# Altium footprint library Connectors THD.PcbLib: 631 footprints (part 37 of 46)
Each footprint in its own frame and in the unit in brackets; x right, y up, seen from the top. Pads: shape width x height; smd on the part's side, far side on the other; paste and mask are expansions set on the pad; w line width, h text height; cw(c..) or ccw(c..) is an arc to the next point about the centre after c.
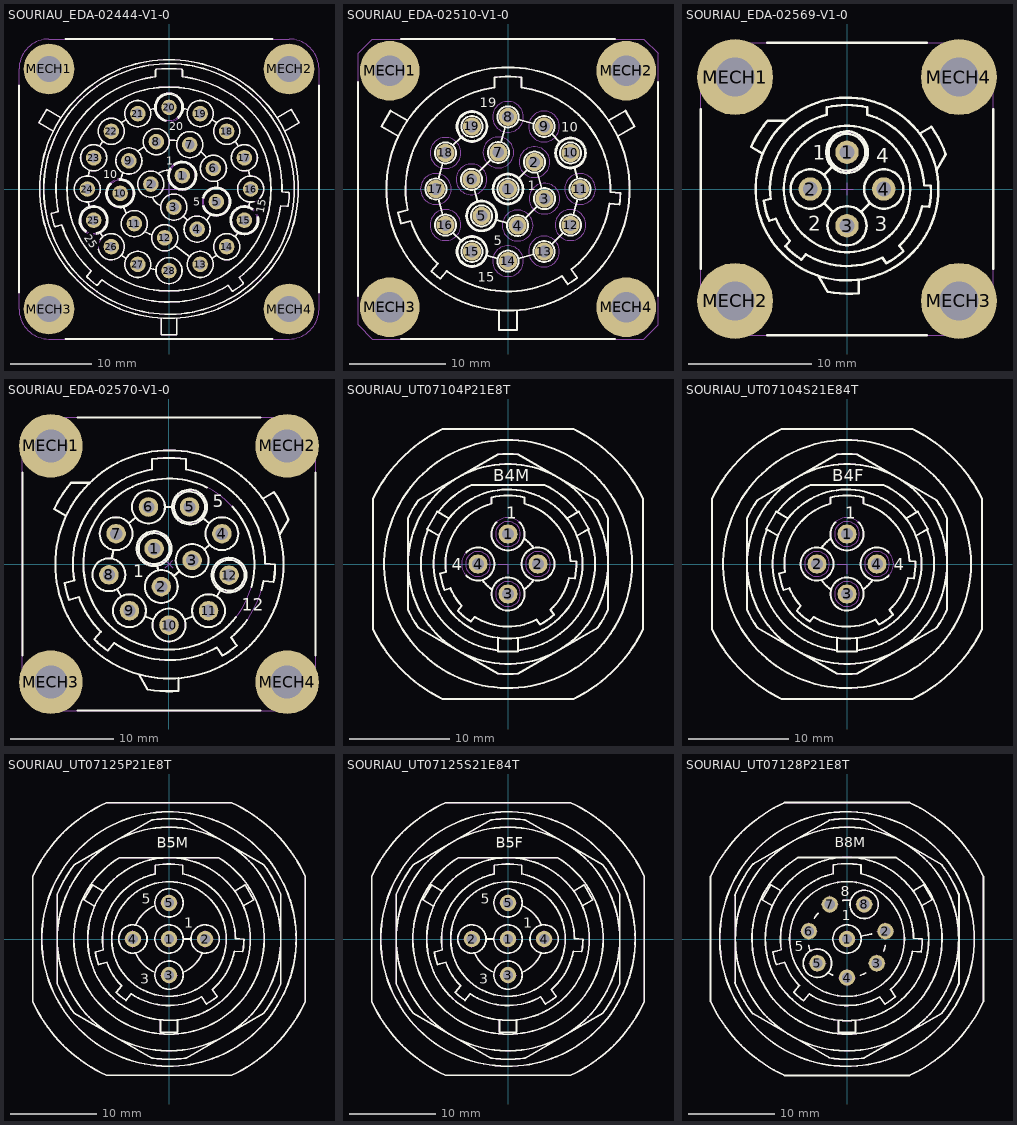
[diagram p36: the footprints below, top view; thin cyan lines are the x and y axes]

## SOURIAU_EDA-02444-V1-0 [mm] "Adapter Kit For PCB Mount For SOURIAU UTG02028S03, 28 Poles, Shell Size 20, Metalok Bantam Circular Female Connecteur"
height 37.35
pads (32):
  round 1.9 hole 1.2: 1(1.626,1.626) 2(-2.222,0.595) 3(0.595,-2.222) 4(3.441,-4.915) 5(5.796,-1.553) 6(5.438,2.536) 7(2.536,5.438) 8(-1.553,5.796) 9(-4.915,3.441) 10(-5.977,-0.523) 11(-4.243,-4.243) 12(-0.523,-5.977) 13(3.827,-9.239) 14(7.071,-7.071) 15(9.239,-3.827) 16(10,0) 17(9.239,3.827) 18(7.071,7.071) 19(3.827,9.239) 20(0,10) 21(-3.827,9.239) 22(-7.071,7.071) 23(-9.239,3.827) 24(-10,0) 25(-9.239,-3.827) 26(-7.071,-7.071) 27(-3.827,-9.239) 28(0,-10)
  round 6.2 hole 3.2: MECH1(-14.7,14.7) MECH2(14.7,14.7) MECH3(-14.7,-14.7) MECH4(14.7,-14.7)
Top Overlay:
  circle w0.2: c-4.915,3.441 r1.6
  circle w0.2: c-1.553,5.796 r1.6
  circle w0.2: c2.536,5.438 r1.6
  circle w0.2: c5.438,2.536 r1.6
  circle w0.2: c3.441,-4.915 r1.6
  circle w0.2: c-0.523,-5.977 r1.6
  circle w0.2: c0.595,-2.222 r1.6
  circle w0.2: c-2.222,0.595 r1.6
  circle w0.2: c-4.243,-4.243 r1.6
  circle w0.2: c7.071,-7.071 r1.6
  circle w0.2: c3.827,-9.239 r1.6
  circle w0.2: c0,-10 r1.6
  circle w0.2: c-3.827,-9.239 r1.6
  circle w0.2: c-10,0 r1.6
  circle w0.2: c-9.239,3.827 r1.6
  circle w0.2: c-7.071,7.071 r1.6
  circle w0.2: c-3.827,9.239 r1.6
  circle w0.2: c3.827,9.239 r1.6
  circle w0.2: c7.071,7.071 r1.6
  circle w0.2: c9.239,3.827 r1.6
  circle w0.2: c0,0 r12.5
  circle w0.2: c0,0 r15.35
  circle w0.2: c0,0 r15.85
  lines w0.2: -18.375,-12.7 -18.375,12.7 ; -14.175,7.093 -15.931,8.107 -14.986,9.743 -13.23,8.729 ; -12.7,-18.375 12.7,-18.375 ; -12.7,18.375 12.7,18.375 ; -10.238,-5.264 cw(c-9.239,-3.827) -8.844,-5.532 ; -10.152,-5.14 cw(c-9.239,-3.827) -8.878,-5.386 ; -9.872,-1.595 ccw(c0,0) -9.731,-2.304 ; -9.872,1.595 cw(c0,0) -9.731,2.304 ; -8.643,-7.367 ccw(c-7.071,-7.071) -8.414,-6.202 ; -8.51,-5.251 ccw(c0,0) -8.108,-5.853 ; -8.51,5.251 cw(c0,0) -8.108,5.853 ; -7.203,0.726 ccw(c-5.977,-0.523) -6.069,1.225 ; -7.098,0.619 ccw(c-5.977,-0.523) -6.061,1.075 ; -5.903,1.075 cw(c0,0) -5.65,2.02 ; -5.853,-8.108 ccw(c0,0) -5.251,-8.51 ; -5.853,8.108 cw(c0,0) -5.251,8.51 ; -5.626,-2.084 ccw(c0,0) -5.213,-2.971 ; -3.831,4.618 cw(c0,0) -3.029,5.179 ; -2.971,-5.213 ccw(c0,0) -2.084,-5.626 ; -2.304,-9.731 ccw(c0,0) -1.595,-9.872 ; -2.304,9.731 cw(c0,0) -1.595,9.872 ; -2.072,-0.998 ccw(c0,0) -0.998,-2.072 ; -1.296,1.9 cw(c0,0) 0.172,2.294 ; -0.945,-15.822 -0.945,-17.85 0.945,-17.85 0.945,-15.822 ; -0.395,8.295 cw(c0,10) 1.16,8.689 ; -0.361,8.441 cw(c0,10) 1.06,8.802 ; 0.034,6 cw(c0,0) 1.008,5.915 ; 0.115,2.508 ccw(c1.626,1.626) 0.567,3.019 ; 0.244,2.433 ccw(c1.626,1.626) 0.658,2.9 ; 0.757,-6.937 2.547,-8.279 ; 1.595,9.872 cw(c0,0) 2.304,9.731 ; 1.757,-3.321 2.279,-3.815 ; 3.883,4.574 cw(c0,0) 4.574,3.883 ; 4.111,-1.08 cw(c5.796,-1.553) 4.13,-2.09 ; 4.255,-1.121 cw(c5.796,-1.553) 4.273,-2.044 ; 4.618,-3.831 ccw(c0,0) 5.179,-3.029 ; 5.251,-8.51 ccw(c0,0) 5.853,-8.108 ; 5.251,8.51 cw(c0,0) 5.853,8.108 ; 5.915,1.008 cw(c0,0) 6,0.034 ; 8.108,-5.853 ccw(c0,0) 8.51,-5.251 ; 8.108,5.853 cw(c0,0) 8.51,5.251 ; 9.731,-2.304 ccw(c0,0) 9.872,-1.595 ; 9.731,2.304 cw(c0,0) 9.872,1.595 ; 10.168,-2.525 ccw(c9.239,-3.827) 10.789,-3.429 ; 10.255,-2.402 ccw(c9.239,-3.827) 10.934,-3.392 ; 10.407,-1.547 cw(c10,0) 11.118,-1.144 ; 13.23,8.729 14.986,9.743 15.931,8.107 14.175,7.093 ; 18.375,-12.7 18.375,12.7 ; -14.414,-3.13 cw(c-14.267,-3.098) -14.306,-2.953 -13.573,-2.757 cw(c0,0) -1.65,13.751 -1.65,14.523 cw(c-1.5,14.523) -1.515,14.672 cw(c0,0) 1.515,14.672 cw(c1.5,14.523) 1.65,14.523 1.65,13.751 cw(c0,0) 13.845,-0.358 14.602,-0.424 cw(c14.589,-0.574) 14.739,-0.58 cw(c0,0) 14.615,-1.989 cw(c14.467,-1.968) 14.454,-2.118 13.697,-2.052 cw(c0,0) 8.625,-10.836 9.061,-11.458 cw(c8.938,-11.544) 9.03,-11.663 cw(c0,0) 7.871,-12.474 cw(c7.791,-12.347) 7.668,-12.433 7.233,-11.811 cw(c0,0) -8.235,-11.136 -8.723,-11.718 cw(c-8.838,-11.621) -8.928,-11.741 cw(c0,0) -10.012,-10.832 cw(c-9.91,-10.721) -10.025,-10.625 -9.537,-10.043 cw(c0,0) -13.133,-4.399 -13.866,-4.595 cw(c-13.905,-4.451) -14.048,-4.496 cw(c0,0) -14.414,-3.13
  text "25" at -10.429,-5.998 h1
  text "20" at 0,7.2 h1
  text "15" at 11.634,-3.04 h1
  text "10" at -8.041,1.315 h1
  text "5" at 2.962,-2.053 h1
  text "1" at -0.331,2.965 h1
Mechanical 8:
  circle w0.1: c-14.7,-14.7 r1.6
  circle w0.1: c14.7,-14.7 r1.6
  circle w0.1: c14.7,14.7 r1.6
  circle w0.1: c-14.7,14.7 r1.6
  lines w0.1: -15.2,-14.7 -14.7,-14.7 ; -15.2,14.7 -14.7,14.7 ; -14.7,-15.2 -14.7,-14.7 ; -14.7,-14.2 -14.7,-14.7 ; -14.7,14.2 -14.7,14.7 ; -14.7,15.2 -14.7,14.7 ; -14.2,-14.7 -14.7,-14.7 ; -14.2,14.7 -14.7,14.7 ; -10.5,0 -10,0 ; -10,-0.5 -10,0 ; -10,0.5 -10,0 ; -9.739,-3.827 -9.239,-3.827 ; -9.739,3.827 -9.239,3.827 ; -9.5,0 -10,0 ; -9.239,-4.327 -9.239,-3.827 ; -9.239,-3.327 -9.239,-3.827 ; -9.239,3.327 -9.239,3.827 ; -9.239,4.327 -9.239,3.827 ; -8.739,-3.827 -9.239,-3.827 ; -8.739,3.827 -9.239,3.827 ; -7.571,-7.071 -7.071,-7.071 ; -7.571,7.071 -7.071,7.071 ; -7.071,-7.571 -7.071,-7.071 ; -7.071,-6.571 -7.071,-7.071 ; -7.071,6.571 -7.071,7.071 ; -7.071,7.571 -7.071,7.071 ; -6.571,-7.071 -7.071,-7.071 ; -6.571,7.071 -7.071,7.071 ; -6.477,-0.523 -5.977,-0.523 ; -5.977,-1.023 -5.977,-0.523 ; -5.977,-0.023 -5.977,-0.523 ; -5.477,-0.523 -5.977,-0.523 ; -5.415,3.441 -4.915,3.441 ; -4.915,2.941 -4.915,3.441 ; -4.915,3.941 -4.915,3.441 ; -4.743,-4.243 -4.243,-4.243 ; -4.415,3.441 -4.915,3.441 ; -4.327,-9.239 -3.827,-9.239 ; -4.327,9.239 -3.827,9.239 ; -4.243,-4.743 -4.243,-4.243 ; -4.243,-3.743 -4.243,-4.243 ; -3.827,-9.739 -3.827,-9.239 ; -3.827,-8.739 -3.827,-9.239 ; -3.827,8.739 -3.827,9.239 ; -3.827,9.739 -3.827,9.239 ; -3.743,-4.243 -4.243,-4.243 ; -3.327,-9.239 -3.827,-9.239 ; -3.327,9.239 -3.827,9.239 ; -2.722,0.595 -2.222,0.595 ; -2.222,0.095 -2.222,0.595 ; -2.222,1.095 -2.222,0.595 ; -2.053,5.796 -1.553,5.796 ; -1.722,0.595 -2.222,0.595 ; -1.553,5.296 -1.553,5.796 ; -1.553,6.296 -1.553,5.796 ; -1.053,5.796 -1.553,5.796 ; -1.023,-5.977 -0.523,-5.977 ; -1,0 0,0 ; -0.523,-6.477 -0.523,-5.977 ; -0.523,-5.477 -0.523,-5.977 ; -0.5,-10 0,-10 ; -0.5,10 0,10 ; -0.023,-5.977 -0.523,-5.977 ; 0,-10.5 0,-10 ; 0,-9.5 0,-10 ; 0,-1 0,0 ; 0,1 0,0 ; 0,9.5 0,10 ; 0,10.5 0,10 ; 0.095,-2.222 0.595,-2.222 ; 0.5,-10 0,-10 ; 0.5,10 0,10 ; 0.595,-2.722 0.595,-2.222 ; 0.595,-1.722 0.595,-2.222 ; 1,0 0,0 ; 1.095,-2.222 0.595,-2.222 ; 1.126,1.626 1.626,1.626 ; 1.626,1.126 1.626,1.626 ; 1.626,2.126 1.626,1.626 ; 2.036,5.438 2.536,5.438 ; 2.126,1.626 1.626,1.626 ; 2.536,4.938 2.536,5.438 ; 2.536,5.938 2.536,5.438 ; 2.941,-4.915 3.441,-4.915 ; 3.036,5.438 2.536,5.438 ; 3.327,-9.239 3.827,-9.239 ; 3.327,9.239 3.827,9.239 ; 3.441,-5.415 3.441,-4.915 ; 3.441,-4.415 3.441,-4.915 ; 3.827,-9.739 3.827,-9.239 ; 3.827,-8.739 3.827,-9.239 ; 3.827,8.739 3.827,9.239 ; 3.827,9.739 3.827,9.239 ; 3.941,-4.915 3.441,-4.915 ; 4.327,-9.239 3.827,-9.239 ; 4.327,9.239 3.827,9.239 ; 4.938,2.536 5.438,2.536 ; 5.296,-1.553 5.796,-1.553 ; 5.438,2.036 5.438,2.536 ; 5.438,3.036 5.438,2.536 ; 5.796,-2.053 5.796,-1.553 ; 5.796,-1.053 5.796,-1.553 ; 5.938,2.536 5.438,2.536 ; 6.296,-1.553 5.796,-1.553 ; 6.571,-7.071 7.071,-7.071 ; 6.571,7.071 7.071,7.071 ; 7.071,-7.571 7.071,-7.071 ; 7.071,-6.571 7.071,-7.071 ; 7.071,6.571 7.071,7.071 ; 7.071,7.571 7.071,7.071 ; 7.571,-7.071 7.071,-7.071 ; 7.571,7.071 7.071,7.071 ; 8.739,-3.827 9.239,-3.827 ; 8.739,3.827 9.239,3.827 ; 9.239,-4.327 9.239,-3.827 ; 9.239,-3.327 9.239,-3.827 ; 9.239,3.327 9.239,3.827 ; 9.239,4.327 9.239,3.827 ; 9.5,0 10,0 ; 9.739,-3.827 9.239,-3.827 ; 9.739,3.827 9.239,3.827 ; 10,-0.5 10,0 ; 10,0.5 10,0 ; 10.5,0 10,0 ; 14.2,-14.7 14.7,-14.7 ; 14.2,14.7 14.7,14.7 ; 14.7,-15.2 14.7,-14.7 ; 14.7,-14.2 14.7,-14.7 ; 14.7,14.2 14.7,14.7 ; 14.7,15.2 14.7,14.7 ; 15.2,-14.7 14.7,-14.7 ; 15.2,14.7 14.7,14.7
Mechanical 14:
  drawing of 167 lines, arcs and shapes, not listed
  text "25" at -10.429,-5.998 h1
  text "20" at -0.15,7.037 h1
  text "15" at 11.634,-3.04 h1
  text "10" at -8.041,1.315 h1
  text "5" at 2.962,-2.053 h1
  text "1" at -0.331,2.965 h1
3D body: height 37, standoff -5.61, extent -18.375,-18.375 18.375,18.375

## SOURIAU_EDA-02510-V1-0 [mm] "Adapter Kit For PCB Mount For SOURIAU UTO02448P21T, 19 Poles, Shell Size 16, UT Bantam Circular Male Connector"
height 33.7
pads (23):
  round 1.9 hole 1.2: 1(0,0) 2(2.75,2.8) 3(3.8,-1) 4(1,-3.8) 5(-2.75,-2.8) 6(-3.8,1) 7(-1,3.8) 8(0,7.5) 9(3.75,6.5) 10(6.5,3.75) 11(7.5,0) 12(6.5,-3.75) 13(3.75,-6.5) 14(0,-7.5) 15(-3.75,-6.5) 16(-6.5,-3.75) 17(-7.5,0) 18(-6.5,3.75) 19(-3.75,6.5)
  round 6.2 hole 3.2: MECH1(-12.3,12.3) MECH2(12.3,12.3) MECH3(-12.3,-12.3) MECH4(12.3,-12.3)
Top Overlay:
  circle w0.2: c-3.75,-6.5 r1.1
  circle w0.2: c-3.75,-6.5 r1.5
  circle w0.2: c-3.75,-6.5 r1.6
  circle w0.2: c6.5,3.75 r1.1
  circle w0.2: c-3.75,6.5 r1.1
  circle w0.2: c-2.75,-2.8 r1.1
  circle w0.2: c-2.75,-2.8 r1.5
  circle w0.2: c-2.75,-2.8 r1.6
  circle w0.2: c6.5,3.75 r1.1
  circle w0.2: c6.5,3.75 r1.5
  circle w0.2: c6.5,3.75 r1.6
  circle w0.2: c-3.75,6.5 r1.5
  circle w0.2: c-3.75,6.5 r1.6
  circle w0.2: c-6.5,3.75 r1.1
  circle w0.2: c-7.5,0 r1.1
  circle w0.2: c-6.5,-3.75 r1.1
  circle w0.2: c0,-7.5 r1.1
  circle w0.2: c3.75,-6.5 r1.1
  circle w0.2: c6.5,-3.75 r1.1
  circle w0.2: c7.5,0 r1.1
  circle w0.2: c3.75,6.5 r1.1
  circle w0.2: c0,7.5 r1.1
  circle w0.2: c-1,3.8 r1.1
  circle w0.2: c-3.8,1 r1.1
  circle w0.2: c1,-3.8 r1.1
  circle w0.2: c3.8,-1 r1.1
  circle w0.2: c2.75,2.8 r1.1
  circle w0.2: c0,0 r1.1
  circle w0.2: c0,0 r1.5
  circle w0.2: c0,0 r1.6
  circle w0.2: c0,0 r12.65
  lines w0.2: -15.6,-11.134 -15.6,11.134 ; -11.397,5.489 -13.16,6.507 -12.215,8.143 -10.452,7.126 ; -11.134,-15.6 11.134,-15.6 ; -11.134,15.6 11.134,15.6 ; -7.217,-1.063 -6.783,-2.687 ; -7.217,1.063 -6.783,2.687 ; -5.722,-4.528 -4.881,-5.369 ; -5.722,4.528 -4.881,5.369 ; -3.507,-0.06 -3.176,-1.258 ; -3.022,1.778 -1.778,3.022 ; -2.204,-6.912 -1.063,-7.217 ; -1.204,-3.212 -0.063,-3.517 ; -0.945,-12.615 -0.945,-14.65 0.945,-14.65 0.945,-12.615 ; -0.713,4.862 -0.287,6.438 ; 1.063,-7.217 2.687,-6.783 ; 1.063,7.217 2.687,6.783 ; 1.121,1.142 1.979,2.015 ; 1.778,-3.022 3.022,-1.778 ; 3.043,1.74 3.507,0.06 ; 4.528,-5.722 5.722,-4.528 ; 4.528,5.722 5.369,4.881 ; 6.783,-2.687 7.217,-1.063 ; 6.912,2.204 7.217,1.063 ; 10.452,7.126 12.215,8.143 13.16,6.507 11.397,5.489 ; 15.6,-11.134 15.6,11.134 ; -11.442,-2.445 ccw(c0,0) -11.131,-3.604 -10.115,-3.332 ccw(c0,0) -7.294,-7.76 -7.97,-8.565 ccw(c0,0) -7.051,-9.337 -6.375,-8.531 ccw(c0,0) 5.607,-9.054 6.211,-9.916 ccw(c0,0) 7.194,-9.227 6.59,-8.366 ccw(c0,0) 10.54,-1.524 11.588,-1.616 ccw(c0,0) 11.692,-0.421 10.645,-0.329 ccw(c0,0) 1.4,10.558 1.4,11.616 ccw(c0,0) -1.4,11.616 -1.4,10.558 ccw(c0,0) -10.426,-2.172 -11.442,-2.445
  text "5" at -1.5,-5.845 h1
  text "15" at -3.136,-9.638 h1
  text "10" at 5.55,5.955 h1
  text "19" at -2.925,8.5 h1
  text "1" at 2.072,-0.107 h1
Mechanical 8:
  lines w0.1: -12.8,-12.3 -12.3,-12.3 ; -12.8,12.3 -12.3,12.3 ; -12.3,-12.8 -12.3,-12.3 ; -12.3,-11.8 -12.3,-12.3 ; -12.3,11.8 -12.3,12.3 ; -12.3,12.8 -12.3,12.3 ; -11.8,-12.3 -12.3,-12.3 ; -11.8,12.3 -12.3,12.3 ; -8,0 -7.5,0 ; -7.5,-0.5 -7.5,0 ; -7.5,0.5 -7.5,0 ; -7,-3.75 -6.5,-3.75 ; -7,0 -7.5,0 ; -7,3.75 -6.5,3.75 ; -6.5,-4.25 -6.5,-3.75 ; -6.5,-3.25 -6.5,-3.75 ; -6.5,3.25 -6.5,3.75 ; -6.5,4.25 -6.5,3.75 ; -6,-3.75 -6.5,-3.75 ; -6,3.75 -6.5,3.75 ; -4.3,1 -3.8,1 ; -4.25,-6.5 -3.75,-6.5 ; -4.25,6.5 -3.75,6.5 ; -3.8,0.5 -3.8,1 ; -3.8,1.5 -3.8,1 ; -3.75,-7 -3.75,-6.5 ; -3.75,-6 -3.75,-6.5 ; -3.75,6 -3.75,6.5 ; -3.75,7 -3.75,6.5 ; -3.3,1 -3.8,1 ; -3.25,-6.5 -3.75,-6.5 ; -3.25,-2.8 -2.75,-2.8 ; -3.25,6.5 -3.75,6.5 ; -2.75,-3.3 -2.75,-2.8 ; -2.75,-2.3 -2.75,-2.8 ; -2.25,-2.8 -2.75,-2.8 ; -1.5,3.8 -1,3.8 ; -1,3.3 -1,3.8 ; -1,4.3 -1,3.8 ; -0.5,-7.5 0,-7.5 ; -0.5,0 0,0 ; -0.5,3.8 -1,3.8 ; -0.5,7.5 0,7.5 ; 0,-8 0,-7.5 ; 0,-7 0,-7.5 ; 0,-0.5 0,0 ; 0,0.5 0,0 ; 0,7 0,7.5 ; 0,8 0,7.5 ; 0.5,-7.5 0,-7.5 ; 0.5,-3.8 1,-3.8 ; 0.5,0 0,0 ; 0.5,7.5 0,7.5 ; 1,-4.3 1,-3.8 ; 1,-3.3 1,-3.8 ; 1.5,-3.8 1,-3.8 ; 2.25,2.8 2.75,2.8 ; 2.75,2.3 2.75,2.8 ; 2.75,3.3 2.75,2.8 ; 3.25,-6.5 3.75,-6.5 ; 3.25,2.8 2.75,2.8 ; 3.25,6.5 3.75,6.5 ; 3.3,-1 3.8,-1 ; 3.75,-7 3.75,-6.5 ; 3.75,-6 3.75,-6.5 ; 3.75,6 3.75,6.5 ; 3.75,7 3.75,6.5 ; 3.8,-1.5 3.8,-1 ; 3.8,-0.5 3.8,-1 ; 4.25,-6.5 3.75,-6.5 ; 4.25,6.5 3.75,6.5 ; 4.3,-1 3.8,-1 ; 6,-3.75 6.5,-3.75 ; 6,3.75 6.5,3.75 ; 6.5,-4.25 6.5,-3.75 ; 6.5,-3.25 6.5,-3.75 ; 6.5,3.25 6.5,3.75 ; 6.5,4.25 6.5,3.75 ; 7,-3.75 6.5,-3.75 ; 7,0 7.5,0 ; 7,3.75 6.5,3.75 ; 7.5,-0.5 7.5,0 ; 7.5,0.5 7.5,0 ; 8,0 7.5,0 ; 11.8,-12.3 12.3,-12.3 ; 11.8,12.3 12.3,12.3 ; 12.3,-12.8 12.3,-12.3 ; 12.3,-11.8 12.3,-12.3 ; 12.3,11.8 12.3,12.3 ; 12.3,12.8 12.3,12.3 ; 12.8,-12.3 12.3,-12.3 ; 12.8,12.3 12.3,12.3
Mechanical 14:
  circle w0.1: c-12.3,12.3 r1.45
  circle w0.1: c-12.3,12.3 r2.8
  circle w0.1: c12.3,12.3 r1.45
  circle w0.1: c12.3,12.3 r2.8
  circle w0.1: c12.3,-12.3 r1.45
  circle w0.1: c12.3,-12.3 r2.8
  circle w0.1: c-12.3,-12.3 r1.45
  circle w0.1: c-12.3,-12.3 r2.8
  circle w0.1: c-3.75,-6.5 r1.6
  circle w0.1: c-2.75,-2.8 r1.6
  circle w0.1: c6.5,3.75 r1.6
  circle w0.1: c-3.75,6.5 r1.6
  circle w0.1: c-6.5,3.75 r1.6
  circle w0.1: c-7.5,0 r1.6
  circle w0.1: c-6.5,-3.75 r1.6
  circle w0.1: c0,-7.5 r1.6
  circle w0.1: c3.75,-6.5 r1.6
  circle w0.1: c6.5,-3.75 r1.6
  circle w0.1: c7.5,0 r1.6
  circle w0.1: c3.75,6.5 r1.6
  circle w0.1: c0,7.5 r1.6
  circle w0.1: c-1,3.8 r1.6
  circle w0.1: c-3.8,1 r1.6
  circle w0.1: c1,-3.8 r1.6
  circle w0.1: c3.8,-1 r1.6
  circle w0.1: c2.75,2.8 r1.6
  circle w0.1: c0,0 r1.6
  circle w0.1: c0,0 r12.65
  lines w0.1: -11.397,5.489 -13.16,6.507 -12.215,8.143 -10.452,7.126 ; -7.088,-1.546 -6.912,-2.204 ; -7.088,1.546 -6.912,2.204 ; -5.369,-4.881 -4.881,-5.369 ; -5.369,4.881 -4.65,5.6 ; -3.374,-0.542 -3.176,-1.258 ; -2.669,2.131 -2.131,2.669 ; -2.204,-6.912 -1.546,-7.088 ; -1.204,-3.212 -0.546,-3.388 ; -0.945,-12.615 -0.945,-14.65 0.945,-14.65 0.945,-12.615 ; -0.583,5.345 -0.417,5.955 ; 1.121,1.142 1.629,1.658 ; 1.546,-7.088 2.204,-6.912 ; 1.546,7.088 2.204,6.912 ; 2.131,-2.669 2.669,-2.131 ; 3.176,1.258 3.374,0.542 ; 4.881,-5.369 5.369,-4.881 ; 4.881,5.369 5.369,4.881 ; 6.912,-2.204 7.088,-1.546 ; 6.912,2.204 7.088,1.546 ; 10.452,7.126 12.215,8.143 13.16,6.507 11.397,5.489 ; -15.6,-14.1 -15.6,14.1 -14.1,15.6 14.1,15.6 15.6,14.1 15.6,-14.1 14.1,-15.6 -14.1,-15.6 -15.6,-14.1 ; -13.462,-12.656 ccw(c-13.27,-12.86) -13.19,-13.128 cw(c-13.049,-13.598) -12.572,-13.485 ccw(c-12.3,-13.42) -12.028,-13.485 cw(c-11.551,-13.598) -11.41,-13.128 ccw(c-11.33,-12.86) -11.138,-12.656 cw(c-10.802,-12.3) -11.138,-11.944 ccw(c-11.33,-11.74) -11.41,-11.472 cw(c-11.551,-11.002) -12.028,-11.115 ccw(c-12.3,-11.18) -12.572,-11.115 cw(c-13.049,-11.002) -13.19,-11.472 ccw(c-13.27,-11.74) -13.462,-11.944 cw(c-13.798,-12.3) -13.462,-12.656 ; -13.462,11.944 ccw(c-13.27,11.74) -13.19,11.472 cw(c-13.049,11.002) -12.572,11.115 ccw(c-12.3,11.18) -12.028,11.115 cw(c-11.551,11.002) -11.41,11.472 ccw(c-11.33,11.74) -11.138,11.944 cw(c-10.802,12.3) -11.138,12.656 ccw(c-11.33,12.86) -11.41,13.128 cw(c-11.551,13.598) -12.028,13.485 ccw(c-12.3,13.42) -12.572,13.485 cw(c-13.049,13.598) -13.19,13.128 ccw(c-13.27,12.86) -13.462,12.656 cw(c-13.798,12.3) -13.462,11.944 ; -11.442,-2.445 ccw(c0,0) -11.131,-3.604 -10.115,-3.332 ccw(c0,0) -7.294,-7.76 -7.97,-8.565 ccw(c0,0) -7.051,-9.337 -6.375,-8.531 ccw(c0,0) 5.607,-9.054 6.211,-9.916 ccw(c0,0) 7.194,-9.227 6.59,-8.366 ccw(c0,0) 10.54,-1.524 11.588,-1.616 ccw(c0,0) 11.692,-0.421 10.645,-0.329 ccw(c0,0) 1.4,10.558 1.4,11.616 ccw(c0,0) -1.4,11.616 -1.4,10.558 ccw(c0,0) -10.426,-2.172 -11.442,-2.445 ; 11.138,-12.656 ccw(c11.33,-12.86) 11.41,-13.128 cw(c11.551,-13.598) 12.028,-13.485 ccw(c12.3,-13.42) 12.572,-13.485 cw(c13.049,-13.598) 13.19,-13.128 ccw(c13.27,-12.86) 13.462,-12.656 cw(c13.798,-12.3) 13.462,-11.944 ccw(c13.27,-11.74) 13.19,-11.472 cw(c13.049,-11.002) 12.572,-11.115 ccw(c12.3,-11.18) 12.028,-11.115 cw(c11.551,-11.002) 11.41,-11.472 ccw(c11.33,-11.74) 11.138,-11.944 cw(c10.802,-12.3) 11.138,-12.656 ; 11.138,11.944 ccw(c11.33,11.74) 11.41,11.472 cw(c11.551,11.002) 12.028,11.115 ccw(c12.3,11.18) 12.572,11.115 cw(c13.049,11.002) 13.19,11.472 ccw(c13.27,11.74) 13.462,11.944 cw(c13.798,12.3) 13.462,12.656 ccw(c13.27,12.86) 13.19,13.128 cw(c13.049,13.598) 12.572,13.485 ccw(c12.3,13.42) 12.028,13.485 cw(c11.551,13.598) 11.41,13.128 ccw(c11.33,12.86) 11.138,12.656 cw(c10.802,12.3) 11.138,11.944
  text "15" at -4.607,-7.1 h1.2
  text "5" at -3.15,-3.4 h1.2
  text "10" at 5.643,3.15 h1.2
  text "19" at -4.579,5.9 h1.2
  text "1" at -0.143,-0.6 h1.2
3D body: height 33.7, standoff -13.8, extent -15.6,-15.6 15.6,15.6

## SOURIAU_EDA-02569-V1-0 [mm] "Adapter Kit For PCB Mount For SOURIAU UTO0104S21T, 4 Poles, Shell Size 10, UT Bantam Circular Female Connector. UTO Series"
height 24.3
pads (8):
  round 1.9 hole 1.2: 1(0,3) 2(-3,0) 3(0,-3) 4(3,0)
  round 6.2 hole 3.2: MECH1(-9.13,9.13) MECH2(-9.13,-9.13) MECH3(9.13,-9.13) MECH4(9.13,9.13)
Top Overlay:
  circle w0.2: c0,0 r5.15
  circle w0.2: c0,0 r7.455
  circle w0.2: c0,3 r1.7
  circle w0.2: c0,3 r1.5
  circle w0.2: c-3,0 r1.6
  circle w0.2: c0,-3 r1.6
  circle w0.2: c3,0 r1.6
  lines w0.2: -11.91,-6.5 -11.91,6.5 ; -6.877,2.879 -7.819,3.423 cw(c0,0) -6.472,5.564 -4.962,5.564 ; -6.5,-11.91 6.5,-11.91 ; -6.5,11.91 6.5,11.91 ; -2.337,-7.079 -1.582,-8.387 ccw(c0,0) 0.945,-8.483 0.945,-7.395 ; -1.869,-1.131 -1.131,-1.869 ; -1.869,1.131 -1.131,1.869 ; 1.131,-1.869 1.869,-1.131 ; 5.932,4.516 6.874,5.06 cw(c0,0) 8.054,2.823 7.299,1.516 ; 11.91,-6.5 11.91,6.5 ; -6.785,-0.938 ccw(c0,0) -6.345,-2.58 -5.795,-2.433 ccw(c0,0) -4.654,-4.224 -5.02,-4.66 ccw(c0,0) -3.718,-5.753 -3.352,-5.317 ccw(c0,0) 2.876,-5.589 3.202,-6.055 ccw(c0,0) 4.595,-5.08 4.268,-4.614 ccw(c0,0) 6.129,-1.39 6.697,-1.439 ccw(c0,0) 6.845,0.254 6.278,0.304 ccw(c0,0) 1.65,6.065 1.65,6.648 ccw(c0,0) -1.65,6.648 -1.65,6.065 ccw(c0,0) -6.235,-0.791 -6.785,-0.938
  text "3" at 2.275,-3.45 h1.2
  text "2" at -3.15,-3.4 h1.2
  text "1" at -2.8,2.375 h1.2
  text "4" at 2.375,2.15 h1.2
Mechanical 8:
  lines w0.1: -9.63,-9.13 -9.13,-9.13 ; -9.63,9.13 -9.13,9.13 ; -9.13,-9.63 -9.13,-9.13 ; -9.13,-8.63 -9.13,-9.13 ; -9.13,8.63 -9.13,9.13 ; -9.13,9.63 -9.13,9.13 ; -8.63,-9.13 -9.13,-9.13 ; -8.63,9.13 -9.13,9.13 ; -3.5,0 -3,0 ; -3,-0.5 -3,0 ; -3,0.5 -3,0 ; -2.5,0 -3,0 ; -0.5,-3 0,-3 ; -0.5,0 0,0 ; -0.5,3 0,3 ; 0,-3.5 0,-3 ; 0,-2.5 0,-3 ; 0,-0.5 0,0 ; 0,0.5 0,0 ; 0,2.5 0,3 ; 0,3.5 0,3 ; 0.5,-3 0,-3 ; 0.5,0 0,0 ; 0.5,3 0,3 ; 2.5,0 3,0 ; 3,-0.5 3,0 ; 3,0.5 3,0 ; 3.5,0 3,0 ; 8.63,-9.13 9.13,-9.13 ; 8.63,9.13 9.13,9.13 ; 9.13,-9.63 9.13,-9.13 ; 9.13,-8.63 9.13,-9.13 ; 9.13,8.63 9.13,9.13 ; 9.13,9.63 9.13,9.13 ; 9.63,-9.13 9.13,-9.13 ; 9.63,9.13 9.13,9.13
Mechanical 14:
  circle w0.1: c0,3 r1.6
  circle w0.1: c-3,0 r1.6
  circle w0.1: c0,-3 r1.6
  circle w0.1: c3,0 r1.6
  circle w0.1: c0,0 r7.455
  circle w0.1: c0,0 r5.15
  circle w0.1: c-9.13,9.13 r1.55
  circle w0.1: c9.13,9.13 r1.55
  circle w0.1: c9.13,-9.13 r1.55
  circle w0.1: c-9.13,-9.13 r1.55
  lines w0.1: -6.877,2.879 -7.819,3.423 cw(c0,0) -6.472,5.564 -4.962,5.564 ; -2.337,-7.079 -1.582,-8.387 ccw(c0,0) 0.945,-8.483 0.945,-7.395 ; -1.869,-1.131 -1.131,-1.869 ; -1.869,1.131 -1.131,1.869 ; 1.131,-1.869 1.869,-1.131 ; 5.932,4.516 6.874,5.06 cw(c0,0) 8.054,2.823 7.299,1.516 ; -11.91,-10.229 -10.229,-11.91 10.229,-11.91 11.91,-10.229 11.91,10.229 10.229,11.91 -10.229,11.91 -11.91,10.229 -11.91,-10.229 ; -6.785,-0.938 ccw(c0,0) -6.345,-2.58 -5.795,-2.433 ccw(c0,0) -4.654,-4.224 -5.02,-4.66 ccw(c0,0) -3.718,-5.753 -3.352,-5.317 ccw(c0,0) 2.876,-5.589 3.202,-6.055 ccw(c0,0) 4.595,-5.08 4.268,-4.614 ccw(c0,0) 6.129,-1.39 6.697,-1.439 ccw(c0,0) 6.845,0.254 6.278,0.304 ccw(c0,0) 1.65,6.065 1.65,6.648 ccw(c0,0) -1.65,6.648 -1.65,6.065 ccw(c0,0) -6.235,-0.791 -6.785,-0.938
  text "1" at -0.143,2.4 h1.2
  text "4" at 2.571,-0.6 h1.2
  text "3" at -0.4,-3.6 h1.2
  text "2" at -3.4,-0.6 h1.2
3D body: height 24.93, standoff -13.53, extent -12.23,-12.223 12.23,12.224

## SOURIAU_EDA-02570-V1-0 [mm] "Adapter Kit For PCB Mount For SOURIAU UTO01412S21T, 12 Poles, Shell Size 14, UT Bantam Circular Female Connecteur"
height 32.93
pads (16):
  round 1.9 hole 1.2: 1(-1.45,1.5) 2(-0.75,-2.2) 3(2.25,0.35) 4(5.15,2.95) 5(2,5.55) 6(-2,5.55) 7(-5.15,2.95) 8(-5.85,-1.05) 9(-3.85,-4.55) 10(0,-5.95) 11(3.85,-4.55) 12(5.85,-1.09)
  round 6.2 hole 3.2: MECH1(-11.505,11.505) MECH2(11.505,11.505) MECH3(-11.505,-11.505) MECH4(11.505,-11.505)
Top Overlay:
  circle w0.2: c0.043,-0.043 r11.113
  circle w0.2: c5.85,-1.09 r1.5
  circle w0.2: c2,5.55 r1.5
  circle w0.2: c-1.45,1.5 r1.5
  circle w0.2: c-5.85,-1.05 r1.6
  circle w0.2: c-3.85,-4.55 r1.6
  circle w0.2: c-0.75,-2.2 r1.6
  circle w0.2: c0,-5.95 r1.6
  circle w0.2: c3.85,-4.55 r1.6
  circle w0.2: c5.85,-1.09 r1.7
  circle w0.2: c2.25,0.35 r1.6
  circle w0.2: c-1.45,1.5 r1.7
  circle w0.2: c-5.15,2.95 r1.6
  circle w0.2: c5.15,2.95 r1.6
  circle w0.2: c2,5.55 r1.7
  circle w0.2: c-2,5.55 r1.6
  lines w0.2: -14.285,-8.914 -14.285,8.914 ; -10.012,4.689 -11.176,5.361 cw(c0,0) -9.541,7.913 -7.717,7.913 ; -8.914,-14.285 8.914,-14.285 ; -8.914,14.285 8.914,14.285 ; -5.574,0.526 -5.426,1.374 ; -5.056,-2.439 -4.644,-3.161 ; -3.916,3.969 -3.234,4.531 ; -2.93,-10.75 -2.082,-12.219 ccw(c0,0) 0.945,-12.359 0.945,-11.119 ; -2.346,-5.097 -1.504,-5.403 ; -1.153,-0.072 -1.047,-0.628 ; -0.4,5.55 0.4,5.55 ; 0.469,-1.164 1.031,-0.686 ; 1.504,-5.403 2.346,-5.097 ; 3.234,4.531 3.916,3.969 ; 3.441,1.418 3.959,1.882 ; 3.681,7.467 ccw(c0,0) 6.533,-5.16 ; 4.651,-3.165 5.049,-2.475 ; 6.161,5.599 cw(c0,0) 8.013,-2.258 ; 7.608,-5.452 cw(c0,0) 6.043,-7.148 6.604,-7.95 cw(c0,0) 5.212,-8.925 4.65,-8.123 cw(c0,0) -5.34,-7.687 -5.97,-8.437 cw(c0,0) -7.272,-7.344 -6.643,-6.594 cw(c0,0) -8.784,-3.234 -9.729,-3.487 cw(c0,0) -10.169,-1.845 -9.224,-1.592 cw(c0,0) -1.65,9.213 -1.65,10.202 cw(c0,0) 1.65,10.202 1.65,9.213 cw(c0,0) 9.36,0.034 10.335,-0.051 cw(c0,0) 10.187,-1.744 9.212,-1.659 cw(c0,0) 9.006,-2.551 ; 9.126,6.36 10.231,6.998 cw(c0,0) 11.623,4.306 10.775,2.838 ; 14.285,-8.914 14.285,8.914
  text "12" at 7.075,-4.55 h1.2
  text "5" at 4.275,5.525 h1.2
  text "1" at -3.475,-1.3 h1.2
Mechanical 8:
  lines w0.1: -12.005,-11.505 -11.505,-11.505 ; -12.005,11.505 -11.505,11.505 ; -11.505,-12.005 -11.505,-11.505 ; -11.505,-11.005 -11.505,-11.505 ; -11.505,11.005 -11.505,11.505 ; -11.505,12.005 -11.505,11.505 ; -11.005,-11.505 -11.505,-11.505 ; -11.005,11.505 -11.505,11.505 ; -6.35,-1.05 -5.85,-1.05 ; -5.85,-1.55 -5.85,-1.05 ; -5.85,-0.55 -5.85,-1.05 ; -5.65,2.95 -5.15,2.95 ; -5.35,-1.05 -5.85,-1.05 ; -5.15,2.45 -5.15,2.95 ; -5.15,3.45 -5.15,2.95 ; -4.65,2.95 -5.15,2.95 ; -4.35,-4.55 -3.85,-4.55 ; -3.85,-5.05 -3.85,-4.55 ; -3.85,-4.05 -3.85,-4.55 ; -3.35,-4.55 -3.85,-4.55 ; -2.5,5.55 -2,5.55 ; -2,5.05 -2,5.55 ; -2,6.05 -2,5.55 ; -1.95,1.5 -1.45,1.5 ; -1.5,5.55 -2,5.55 ; -1.45,1 -1.45,1.5 ; -1.45,2 -1.45,1.5 ; -1.25,-2.2 -0.75,-2.2 ; -0.95,1.5 -1.45,1.5 ; -0.75,-2.7 -0.75,-2.2 ; -0.75,-1.7 -0.75,-2.2 ; -0.5,-5.95 0,-5.95 ; -0.354,-0.354 0,0 ; -0.354,0.354 0,0 ; -0.25,-2.2 -0.75,-2.2 ; 0,-6.45 0,-5.95 ; 0,-5.45 0,-5.95 ; 0.354,-0.354 0,0 ; 0.354,0.354 0,0 ; 0.5,-5.95 0,-5.95 ; 1.5,5.55 2,5.55 ; 1.75,0.35 2.25,0.35 ; 2,5.05 2,5.55 ; 2,6.05 2,5.55 ; 2.25,-0.15 2.25,0.35 ; 2.25,0.85 2.25,0.35 ; 2.5,5.55 2,5.55 ; 2.75,0.35 2.25,0.35 ; 3.35,-4.55 3.85,-4.55 ; 3.85,-5.05 3.85,-4.55 ; 3.85,-4.05 3.85,-4.55 ; 4.35,-4.55 3.85,-4.55 ; 4.65,2.95 5.15,2.95 ; 5.15,2.45 5.15,2.95 ; 5.15,3.45 5.15,2.95 ; 5.35,-1.09 5.85,-1.09 ; 5.65,2.95 5.15,2.95 ; 5.85,-1.59 5.85,-1.09 ; 5.85,-0.59 5.85,-1.09 ; 6.35,-1.09 5.85,-1.09 ; 11.005,-11.505 11.505,-11.505 ; 11.005,11.505 11.505,11.505 ; 11.505,-12.005 11.505,-11.505 ; 11.505,-11.005 11.505,-11.505 ; 11.505,11.005 11.505,11.505 ; 11.505,12.005 11.505,11.505 ; 12.005,-11.505 11.505,-11.505 ; 12.005,11.505 11.505,11.505